# Altium footprint library xialeste-20221209.PcbLib: 113 footprints (part 7 of 8)
Each footprint in its own frame and in the unit in brackets; x right, y up, seen from the top. Pads: shape width x height; smd on the part's side, far side on the other; paste and mask are expansions set on the pad; w line width, h text height; cw(c..) or ccw(c..) is an arc to the next point about the centre after c.
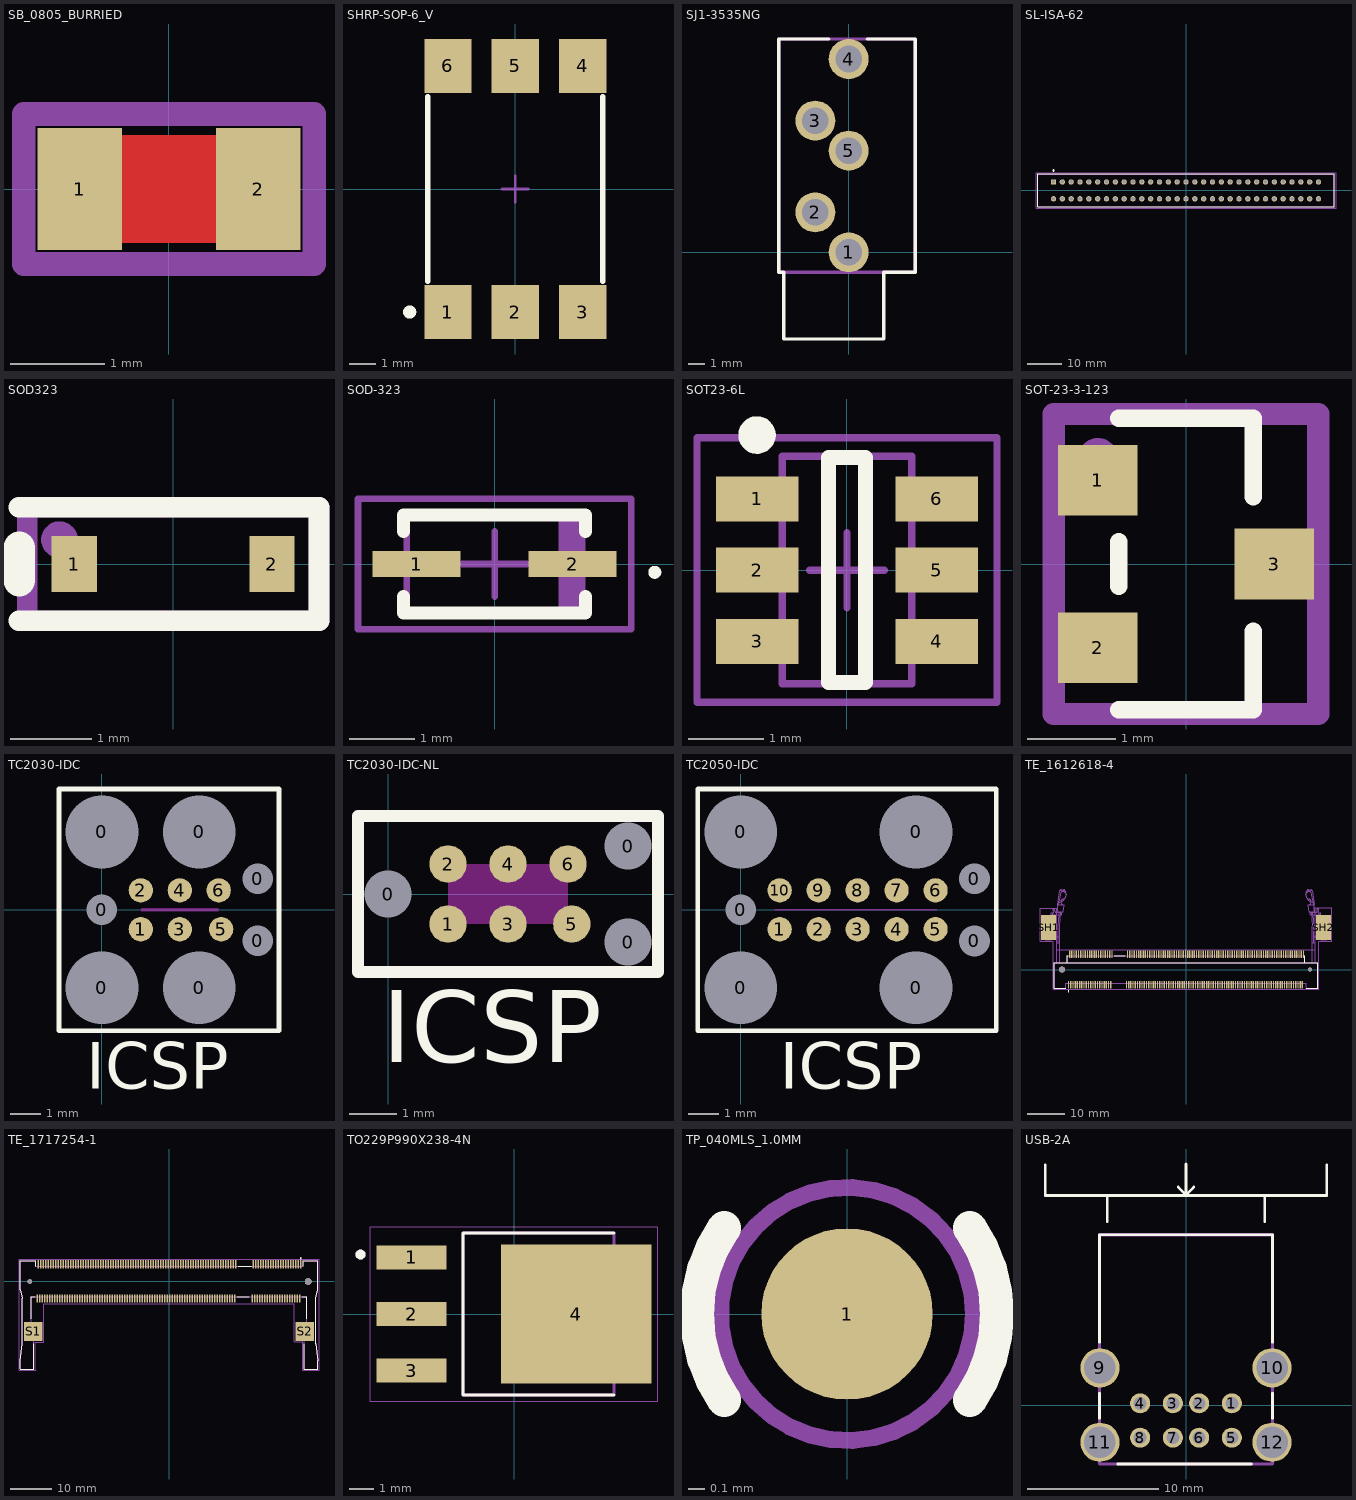
[diagram p6: the footprints below, top view; thin cyan lines are the x and y axes]

## SB_0805_BURRIED [mm]
pads (2):
  rect 0.9x1.3 smd: 1(-0.95,0) 2(0.95,0)
Top Layer:
  region: -0.55,0.575 0.55,0.575 0.55,-0.575 -0.55,-0.575
Mechanical 29:
  lines w0.254: -1.55,-0.8 1.55,-0.8 1.55,0.8 -1.55,0.8 -1.55,-0.8

## SHRP-SOP-6_V [mil] "SOP, 6-Leads, Body 7.12x6.5mm, Pitch 2.54mm"
pads (6):
  rect 70x80 smd: 1(-100,-182.48) 2(0,-182.48) 3(100,-182.48) 4(100,182.48) 5(0,182.48) 6(-100,182.48)
Top Overlay:
  circle w9.84: c-156.69,-182.48 r4.92
  lines w7.87: -129.92,-136.81 -129.92,136.81 ; 129.92,-136.81 129.92,136.81
Mechanical 15:
  lines w3.94: -19.69,0 19.68,0 ; 0,-19.68 0,19.68
3D body "H11L3M.stp": height 156.56, standoff -1.58, extent -173.88,-196 175.88,189.83

## SJ1-3535NG [mm]
pads (5):
  round 2.4 hole 1.6: 1(0,0) 2(-2,2.4) 3(-2,7.9) 4(0,11.6) 5(0,6.1)
Top Overlay:
  lines w0.2: -1.2,12.8 -4.2,12.8 -4.2,-1.2 -3.9,-1.2 -3.9,-5.2 2.1,-5.2 2.1,-1.2 4,-1.2 4,12.8 1.1,12.8
Top Solder:
  region: -1.65,8.65 0.65,6.35 -0.35,5.35 -2.65,7.65
Mechanical 1:
  lines w0.2: -4.2,12.8 -4.2,12.8
Mechanical 29:
  lines w0.2: -4.2,-1.2 4,-1.2 4,12.8 -4.2,12.8 -4.2,-1.2
  text ".Designator" at -2,5.5 h1.2
3D body "ST-215N-01.step": height 12.3, standoff -3.5, extent -4.1,-5.5 4,12.5

## SL-ISA-62 [mil]
pads (62):
  rect 60x60 hole 40: 1(-1500,95.5)
  round 60 hole 40: 2(-1500,-95.5) 3(-1400,95.5) 4(-1400,-95.5) 5(-1300,95.5) 6(-1300,-95.5) 7(-1200,95.5) 8(-1200,-95.5) 9(-1100,95.5) 10(-1100,-95.5) 11(-1000,95.5) 12(-1000,-95.5) 13(-900,95.5) 14(-900,-95.5) 15(-800,95.5) 16(-800,-95.5) 17(-700,95.5) 18(-700,-95.5) 19(-600,95.5) 20(-600,-95.5) 21(-500,95.5) 22(-500,-95.5) 23(-400,95.5) 24(-400,-95.5) 25(-300,95.5) 26(-300,-95.5) 27(-200,95.5) 28(-200,-95.5) 29(-100,95.5) 30(-100,-95.5) 31(0,95.5) 32(0,-95.5) 33(100,95.5) 34(100,-95.5) 35(200,95.5) 36(200,-95.5) 37(300,95.5) 38(300,-95.5) 39(400,95.5) 40(400,-95.5) 41(500,95.5) 42(500,-95.5) 43(600,95.5) 44(600,-95.5) 45(700,95.5) 46(700,-95.5) 47(800,95.5) 48(800,-95.5) 49(900,95.5) 50(900,-95.5) 51(1000,95.5) 52(1000,-95.5) 53(1100,95.5) 54(1100,-95.5) 55(1200,95.5) 56(1200,-95.5) 57(1300,95.5) 58(1300,-95.5) 59(1400,95.5) 60(1400,-95.5) 61(1500,95.5) 62(1500,-95.5)
Top Overlay:
  circle w13.78: c-1500,225 r7.87
  lines w10: -1680,-186.22 -1680,186.22 1680,186.22 1680,-186.22 -1680,-186.22
Mechanical 13:
  lines w10: -1680,-184 -1680,184 1680,184 1680,-184 -1680,-184
Mechanical 15:
  lines w1.97: -1697.83,-201.77 1697.83,-201.77 1697.83,201.77 -1697.83,201.77 -1697.83,-201.77
3D body "c-6-5530843-5-f-3d.stp": height 611.55, standoff -123.45, extent -1680,-184 1680,184

## SOD323 [mil]
pads (2):
  rect 22x27 smd mask+3: 1(-48,0) 2(48,0)
Top Overlay:
  lines w10: -74.8,-27.56 70.87,-27.56 70.87,27.56 -74.8,27.56
  lines w15.75: -74.8,-7.87 -74.8,7.87
Mechanical 29:
  circle w10: c-55.12,11.81 r3.94
  lines w10: -70.87,-27.56 70.87,-27.56 70.87,27.56 -70.87,27.56 -70.87,-27.56
  text ".Designator" at -7.87,-7.87 h15.75
3D body "SOD323.step": height 38.78, standoff -0.2, extent -49.21,-24.6 49.21,24.61

## SOD-323 [mm] "Diode"
height 1
pads (2):
  rect 1.35x0.4 smd: 1(-1.2,0) 2(1.2,0)
Top Overlay:
  circle w0.1: c2.463,-0.127 r0.05
  lines w0.2: -1.4,-0.5 -1.4,-0.75 1.4,-0.75 1.4,-0.5 ; -1.4,0.5 -1.4,0.75 1.4,0.75 1.4,0.5
Mechanical 13:
  region: 1.35,0.724 0.987,0.724 0.987,-0.726 1.35,-0.726
  lines w0.1: -1.35,-0.725 -1.35,0.725 1.35,0.725 1.35,-0.725 -1.35,-0.725
Mechanical 15:
  lines w0.1: -0.5,0 0.5,0 ; 0,-0.5 0,0.5 ; -2.1,-1 -2.1,1 2.1,1 2.1,-1 -2.1,-1
3D body "bat60jfilm.stp": height 1.01, standoff 0, extent -1.243,-0.648 1.243,0.635

## SOT23-6L [mm]
height 1.25
pads (6):
  rect 1.1x0.6 smd: 1(-1.2,0.95) 2(-1.2,0) 3(-1.2,-0.95) 4(1.2,-0.95) 5(1.2,0) 6(1.2,0.95)
Top Overlay:
  circle w0.25: c-1.2,1.8 r0.125
  lines w0.2: -0.25,-1.5 -0.25,1.5 0.25,1.5 0.25,-1.5 -0.25,-1.5
Mechanical 13:
  lines w0.1: -0.865,-1.515 0.865,-1.515 0.865,1.515 -0.865,1.515 -0.865,-1.515
Mechanical 15:
  lines w0.1: -0.5,0 0.5,0 ; 0,-0.5 0,0.5 ; -2,-1.763 2,-1.763 2,1.763 -2,1.763 -2,-1.763
3D body "SOT23-6.step": height 1.1, standoff 0, extent -1.25,-1.5 1.25,1.5

## SOT-23-3-123 [mm]
pads (3):
  rect 0.9x0.8 smd: 1(-1,0.95) 2(-1,-0.95) 3(1,0)
Top Overlay:
  lines w0.2: -0.762,-1.651 0.762,-1.651 0.762,-0.762 ; -0.762,-0.254 -0.762,0.254 ; -0.762,1.651 0.762,1.651 0.762,0.762
Mechanical 29:
  circle w0.254: c-1,1.2 r0.1
  lines w0.254: -1.5,-1.7 -1.5,1.7 1.5,1.7 1.5,-1.7 -1.5,-1.7
  text ".Designator" at 0.3,-0.7 h0.6
3D body: height 0.5, standoff 0, extent -1.27,-1.333 -0.762,-0.572
3D body: height 0.5, standoff 0, extent -1.27,0.572 -0.762,1.333
3D body: height 1.1, standoff 0, extent -0.762,-1.651 0.762,1.651
3D body: height 0.5, standoff 0, extent 0.762,-0.381 1.27,0.381

## TC2030-IDC [mm] "Tag-Connect 6-Pin with Legs (PN# TC2030-IDC-NL)"
pads (13):
  round 2.3 hole 2.375 unplated: 0(0,-2.54) 0(0,2.54) 0(3.175,-2.54) 0(3.175,2.54)
  round 0.9 hole 0.995 unplated: 0(0,0) 0(5.08,-1.016) 0(5.08,1.016)
  round 0.79 smd paste-0.39: 1(1.27,-0.635) 2(1.27,0.635) 3(2.54,-0.635) 4(2.54,0.635) 5(3.89,-0.635) 6(3.81,0.635)
Top Overlay:
  lines w0.15: -1.397,-3.937 5.775,-3.937 5.775,3.937 -1.397,3.937 -1.397,-3.937
  text "ICSP" at -0.508,-5.842 h1.52
Keep-Out Layer:
  rectangle: 1.27,-0.05 3.81,0.05

## TC2030-IDC-NL [mm] "Tag-Connect 6-Pin with No Legs (PN# TC2030-IDC-NL)"
pads (9):
  round 0.9 hole 0.995 unplated: 0(0,0) 0(5.08,-1.016) 0(5.08,1.016)
  round 0.79 smd paste-0.39: 1(1.27,-0.635) 2(1.27,0.635) 3(2.54,-0.635) 4(2.54,0.635) 5(3.89,-0.635) 6(3.81,0.635)
Top Overlay:
  lines w0.254: -0.635,-1.651 5.715,-1.651 5.715,1.651 -0.635,1.651 -0.635,-1.651
  text "ICSP" at -0.127,-3.556 h1.52
Keep-Out Layer:
  rectangle: 1.27,-0.635 3.81,0.635

## TC2050-IDC [mm] "Tag-Connect 6-Pin with Legs (PN# TC2030-IDC-NL)"
pads (17):
  round 2.3 hole 2.375 unplated: 0(0,-2.54) 0(0,2.54) 0(5.715,-2.54) 0(5.715,2.54)
  round 0.9 hole 1 unplated: 0(0,0) 0(7.62,-1.015) 0(7.62,1.015)
  round 0.79 smd paste-0.39: 1(1.27,-0.635) 2(2.54,-0.635) 3(3.81,-0.635) 4(5.08,-0.635) 5(6.35,-0.635) 6(6.35,0.635) 7(5.08,0.635) 8(3.81,0.635) 9(2.54,0.635) 10(1.27,0.635)
Top Overlay:
  lines w0.15: -1.397,-3.937 8.325,-3.937 8.325,3.937 -1.397,3.937 -1.397,-3.937
  text "ICSP" at 1.27,-5.842 h1.52
Keep-Out Layer:
  rectangle: 1.1,-0.025 6.4,0.025

## TE_1612618-4 [mm]
pads (204):
  rect 0.35x2 smd: 1(-31.65,-4.1) 2(-31.35,4.1) 3(-31.05,-4.1) 4(-30.75,4.1) 5(-30.45,-4.1) 6(-30.15,4.1) 7(-29.85,-4.1) 8(-29.55,4.1) 9(-29.25,-4.1) 10(-28.95,4.1) 11(-28.65,-4.1) 12(-28.35,4.1) 13(-28.05,-4.1) 14(-27.75,4.1) 15(-27.45,-4.1) 16(-27.15,4.1) 17(-26.85,-4.1) 18(-26.55,4.1) 19(-26.25,-4.1) 20(-25.95,4.1) 21(-25.65,-4.1) 22(-25.35,4.1) 23(-25.05,-4.1) 24(-24.75,4.1) 25(-24.45,-4.1) 26(-24.15,4.1) 27(-23.85,-4.1) 28(-23.55,4.1) 29(-23.25,-4.1) 30(-22.95,4.1) 31(-22.65,-4.1) 32(-22.35,4.1) 33(-22.05,-4.1) 34(-21.75,4.1) 35(-21.45,-4.1) 36(-21.15,4.1) 37(-20.85,-4.1) 38(-20.55,4.1) 39(-20.25,-4.1) 40(-19.95,4.1) 41(-16.05,-4.1) 42(-15.75,4.1) 43(-15.45,-4.1) 44(-15.15,4.1) 45(-14.85,-4.1) 46(-14.55,4.1) 47(-14.25,-4.1) 48(-13.95,4.1) 49(-13.65,-4.1) 50(-13.35,4.1) 51(-13.05,-4.1) 52(-12.75,4.1) 53(-12.45,-4.1) 54(-12.15,4.1) 55(-11.85,-4.1) 56(-11.55,4.1) 57(-11.25,-4.1) 58(-10.95,4.1) 59(-10.65,-4.1) 60(-10.35,4.1) 61(-10.05,-4.1) 62(-9.75,4.1) 63(-9.45,-4.1) 64(-9.15,4.1) 65(-8.85,-4.1) 66(-8.55,4.1) 67(-8.25,-4.1) 68(-7.95,4.1) 69(-7.65,-4.1) 70(-7.35,4.1) 71(-7.05,-4.1) 72(-6.75,4.1) 73(-6.45,-4.1) 74(-6.15,4.1) 75(-5.85,-4.1) 76(-5.55,4.1) 77(-5.25,-4.1) 78(-4.95,4.1) 79(-4.65,-4.1) 80(-4.35,4.1) 81(-4.05,-4.1) 82(-3.75,4.1) 83(-3.45,-4.1) 84(-3.15,4.1) 85(-2.85,-4.1) 86(-2.55,4.1) 87(-2.25,-4.1) 88(-1.95,4.1) 89(-1.65,-4.1) 90(-1.35,4.1) 91(-1.05,-4.1) 92(-0.75,4.1) 93(-0.45,-4.1) 94(-0.15,4.1) 95(0.15,-4.1) 96(0.45,4.1) 97(0.75,-4.1) 98(1.05,4.1) 99(1.35,-4.1) 100(1.65,4.1) 101(1.95,-4.1) 102(2.25,4.1) 103(2.55,-4.1) 104(2.85,4.1) 105(3.15,-4.1) 106(3.45,4.1) 107(3.75,-4.1) 108(4.05,4.1) 109(4.35,-4.1) 110(4.65,4.1) 111(4.95,-4.1) 112(5.25,4.1) 113(5.55,-4.1) 114(5.85,4.1) 115(6.15,-4.1) 116(6.45,4.1) 117(6.75,-4.1) 118(7.05,4.1) 119(7.35,-4.1) 120(7.65,4.1) 121(7.95,-4.1) 122(8.25,4.1) 123(8.55,-4.1) 124(8.85,4.1) 125(9.15,-4.1) 126(9.45,4.1) 127(9.75,-4.1) 128(10.05,4.1) 129(10.35,-4.1) 130(10.65,4.1) 131(10.95,-4.1) 132(11.25,4.1) 133(11.55,-4.1) 134(11.85,4.1) 135(12.15,-4.1) 136(12.45,4.1) 137(12.75,-4.1) 138(13.05,4.1) 139(13.35,-4.1) 140(13.65,4.1) 141(13.95,-4.1) 142(14.25,4.1) 143(14.55,-4.1) 144(14.85,4.1) 145(15.15,-4.1) 146(15.45,4.1) 147(15.75,-4.1) 148(16.05,4.1) 149(16.35,-4.1) 150(16.65,4.1) 151(16.95,-4.1) 152(17.25,4.1) 153(17.55,-4.1) 154(17.85,4.1) 155(18.15,-4.1) 156(18.45,4.1) 157(18.75,-4.1) 158(19.05,4.1) 159(19.35,-4.1) 160(19.65,4.1) 161(19.95,-4.1) 162(20.25,4.1) 163(20.55,-4.1) 164(20.85,4.1) 165(21.15,-4.1) 166(21.45,4.1) 167(21.75,-4.1) 168(22.05,4.1) 169(22.35,-4.1) 170(22.65,4.1) 171(22.95,-4.1) 172(23.25,4.1) 173(23.55,-4.1) 174(23.85,4.1) 175(24.15,-4.1) 176(24.45,4.1) 177(24.75,-4.1) 178(25.05,4.1) 179(25.35,-4.1) 180(25.65,4.1) 181(25.95,-4.1) 182(26.25,4.1) 183(26.55,-4.1) 184(26.85,4.1) 185(27.15,-4.1) 186(27.45,4.1) 187(27.75,-4.1) 188(28.05,4.1) 189(28.35,-4.1) 190(28.65,4.1) 191(28.95,-4.1) 192(29.25,4.1) 193(29.55,-4.1) 194(29.85,4.1) 195(30.15,-4.1) 196(30.45,4.1) 197(30.75,-4.1) 198(31.05,4.1) 199(31.35,-4.1) 200(31.65,4.1)
  rect 4x6.8 smd: SH1(-37,11.3) SH2(37,11.3)
  round 1.6 hole 1.6 unplated: ""(-33.4,0)
  round 1.1 hole 1.1 unplated: ""(33.4,0)
Top Overlay:
  circle w0.2: c-31.65,-5.85 r0.1
  lines w0.127: -32.35,-5 -35.55,-5 -35.55,1.85 -32,1.85 ; -31.71,3.7 -32,3.7 -32,1.85 ; -19.35,3.7 -16.35,3.7 ; 32,3.7 32,1.85 ; 32.4,-5 35.55,-5 35.55,1.85 32,1.85 ; -32,1.85 32,1.85
Mechanical 13:
  circle w0.2: c-31.646,-3.325 r0.1
  lines w0.127: -36.3,14.7 -34.1,14.7 ; -35.85,9.7 -35.85,15.3 ; -35.846,9.69 -34.418,8.65 ; -34.85,1.842 -34.85,7.25 ; -34.488,18.1 ccw(c-34.45,20.25) -32.3,20.212 ; -34.402,8.64 -34.402,7.25 ; -34.4,7.4 -34.4,11.6 -34.1,14.7 ; -33.957,21.167 -34.6,17.4 ; -33.956,21.169 cw(c-33.562,21.1) -33.562,21.5 -32.947,21.5 cw(c-32.947,21.1) -32.591,21.282 ; -33.95,1.842 -33.95,7.25 -34.402,7.25 ; -33.95,7.3 -33.95,11.7 -33.7,15.4 ; -33.662,20.774 -34.3,17.4 ; -33.661,20.776 cw(c-33.269,20.7) -33.269,21.1 -33.114,21.1 cw(c-33.114,20.7) -32.783,20.924 ; -33.067,15.658 cw(c-33.263,15.7) -33.263,15.5 -34.4,15.5 cw(c-34.4,15.7) -34.6,15.7 -34.6,17.4 ; -33.067,15.66 -32.758,17.16 ccw(c-32.954,17.2) -32.954,17.4 -34.3,17.4 ; -32.781,20.922 -32.7,20.8 ; -32.589,21.279 -32.4,20.9 ; 32.3,20.212 ccw(c34.45,20.25) 34.488,18.1 ; 32.589,21.279 32.4,20.9 ; 32.591,21.282 cw(c32.947,21.1) 32.947,21.5 33.563,21.5 cw(c33.562,21.1) 33.956,21.169 ; 32.781,20.922 32.7,20.8 ; 32.783,20.924 cw(c33.114,20.7) 33.114,21.1 33.269,21.1 cw(c33.269,20.7) 33.661,20.776 ; 33.067,15.658 ccw(c33.263,15.7) 33.263,15.5 34.4,15.5 ccw(c34.4,15.7) 34.6,15.7 34.6,17.4 ; 33.067,15.66 32.758,17.16 cw(c32.954,17.2) 32.954,17.4 34.3,17.4 ; 33.662,20.774 34.3,17.4 ; 33.7,15.4 33.95,11.7 33.95,7.3 ; 33.95,1.842 33.95,7.25 34.402,7.25 ; 33.957,21.167 34.6,17.4 ; 34.4,7.4 34.4,11.6 34.1,14.7 ; 34.402,8.64 34.402,7.25 ; 34.418,8.65 35.846,9.69 ; 34.85,1.842 34.85,7.25 ; 35.85,9.7 35.85,15.3 ; 36.3,14.7 34.1,14.7 ; -36.35,9.692 -34.85,8.65 -34.85,7.25 ; -36.35,9.692 -36.35,8 -37.95,8 -37.95,14.5 -36.35,14.5 ; -36.35,9.692 -36.35,14.5 ; -36.35,14.5 -36.35,15.3 -35.85,15.3 ; -35.85,15.3 -35.6,15.3 -35.6,15.7 -35.8,15.8 -35.8,16.2 ; -35.8,16.2 -35.4,16.2 ; -35.8,16.2 -35.8,16.45 -35.4,16.45 -35.4,16.2 ; -35.4,16.2 -35.4,15.8 -35.2,15.4 -34.1,15.4 ; -34.85,7.25 -34.402,7.25 ; -34.6,17.4 -34.3,17.4 ; -34.1,14.7 -33.5,14.7 -33.5,15.4 -34.1,15.4 ; -34.1,14.7 -34.1,15.4 ; -32.7,20.8 -32.4,20.6 -32.4,20.9 ; -32.7,20.8 -32.4,20.9 ; -32,1.85 -32,3.7 32,3.7 32,1.85 ; -32,1.85 -35.55,1.85 -35.55,-5 -32.35,-5 -32.35,-3.7 32.4,-3.7 32.4,-5 35.55,-5 35.55,1.85 32,1.85 ; -32,1.85 32,1.85 ; 32.4,20.9 32.4,20.6 32.7,20.8 ; 32.4,20.9 32.7,20.8 ; 34.1,14.7 33.5,14.7 33.5,15.4 34.1,15.4 ; 34.1,14.7 34.1,15.4 ; 34.1,15.4 35.2,15.4 35.4,15.8 35.4,16.2 ; 34.3,17.4 34.6,17.4 ; 34.402,7.25 34.85,7.25 ; 34.85,7.25 34.85,8.65 36.35,9.692 ; 35.4,16.2 35.8,16.2 ; 35.4,16.2 35.4,16.45 35.8,16.45 35.8,16.2 ; 35.8,16.2 35.8,15.8 35.6,15.7 35.6,15.3 35.85,15.3 ; 35.85,15.3 36.35,15.3 36.35,14.5 ; 36.35,9.692 36.35,8 37.95,8 37.95,14.5 36.35,14.5 ; 36.35,9.692 36.35,14.5
  lines w0.254: -33.701,18.205 cw(c-33.1,18.3) -33.195,18.901 ; -33.7,18.2 ccw(c-32.9,18.2) -32.9,17.4 ; -33.206,18.899 ccw(c-33.4,20) -32.299,20.194 ; -32.4,20.6 -32.3,20.2 ; 32.299,20.194 ccw(c33.4,20) 33.206,18.899 ; 32.3,20.2 32.4,20.6 ; 32.9,17.4 ccw(c32.9,18.2) 33.7,18.2 ; 33.195,18.901 cw(c33.1,18.3) 33.701,18.205
Mechanical 15:
  lines w0.05: -39.25,7.65 -39.25,16.5 -34.8,16.5 -34.8,5.35 34.8,5.35 34.8,16.6 39.25,16.6 39.25,7.65 35.8,7.65 35.8,-5.35 -35.8,-5.35 -35.8,7.65 -39.25,7.65
3D body "1612618-4.stp": height 9.47, standoff -0.66, extent -37.9,-5 38,21.556

## TE_1717254-1 [mm]
height 0.254
pads (204):
  rect 0.35x2 smd: 1(31.65,4.1) 2(31.35,-4.1) 3(31.05,4.1) 4(30.75,-4.1) 5(30.45,4.1) 6(30.15,-4.1) 7(29.85,4.1) 8(29.55,-4.1) 9(29.25,4.1) 10(28.95,-4.1) 11(28.65,4.1) 12(28.35,-4.1) 13(28.05,4.1) 14(27.75,-4.1) 15(27.45,4.1) 16(27.15,-4.1) 17(26.85,4.1) 18(26.55,-4.1) 19(26.25,4.1) 20(25.95,-4.1) 21(25.65,4.1) 22(25.35,-4.1) 23(25.05,4.1) 24(24.75,-4.1) 25(24.45,4.1) 26(24.15,-4.1) 27(23.85,4.1) 28(23.55,-4.1) 29(23.25,4.1) 30(22.95,-4.1) 31(22.65,4.1) 32(22.35,-4.1) 33(22.05,4.1) 34(21.75,-4.1) 35(21.45,4.1) 36(21.15,-4.1) 37(20.85,4.1) 38(20.55,-4.1) 39(20.25,4.1) 40(19.95,-4.1) 41(16.05,4.1) 42(15.75,-4.1) 43(15.45,4.1) 44(15.15,-4.1) 45(14.85,4.1) 46(14.55,-4.1) 47(14.25,4.1) 48(13.95,-4.1) 49(13.65,4.1) 50(13.35,-4.1) 51(13.05,4.1) 52(12.75,-4.1) 53(12.45,4.1) 54(12.15,-4.1) 55(11.85,4.1) 56(11.55,-4.1) 57(11.25,4.1) 58(10.95,-4.1) 59(10.65,4.1) 60(10.35,-4.1) 61(10.05,4.1) 62(9.75,-4.1) 63(9.45,4.1) 64(9.15,-4.1) 65(8.85,4.1) 66(8.55,-4.1) 67(8.25,4.1) 68(7.95,-4.1) 69(7.65,4.1) 70(7.35,-4.1) 71(7.05,4.1) 72(6.75,-4.1) 73(6.45,4.1) 74(6.15,-4.1) 75(5.85,4.1) 76(5.55,-4.1) 77(5.25,4.1) 78(4.95,-4.1) 79(4.65,4.1) 80(4.35,-4.1) 81(4.05,4.1) 82(3.75,-4.1) 83(3.45,4.1) 84(3.15,-4.1) 85(2.85,4.1) 86(2.55,-4.1) 87(2.25,4.1) 88(1.95,-4.1) 89(1.65,4.1) 90(1.35,-4.1) 91(1.05,4.1) 92(0.75,-4.1) 93(0.45,4.1) 94(0.15,-4.1) 95(-0.15,4.1) 96(-0.45,-4.1) 97(-0.75,4.1) 98(-1.05,-4.1) 99(-1.35,4.1) 100(-1.65,-4.1) 101(-1.95,4.1) 102(-2.25,-4.1) 103(-2.55,4.1) 104(-2.85,-4.1) 105(-3.15,4.1) 106(-3.45,-4.1) 107(-3.75,4.1) 108(-4.05,-4.1) 109(-4.35,4.1) 110(-4.65,-4.1) 111(-4.95,4.1) 112(-5.25,-4.1) 113(-5.55,4.1) 114(-5.85,-4.1) 115(-6.15,4.1) 116(-6.45,-4.1) 117(-6.75,4.1) 118(-7.05,-4.1) 119(-7.35,4.1) 120(-7.65,-4.1) 121(-7.95,4.1) 122(-8.25,-4.1) 123(-8.55,4.1) 124(-8.85,-4.1) 125(-9.15,4.1) 126(-9.45,-4.1) 127(-9.75,4.1) 128(-10.05,-4.1) 129(-10.35,4.1) 130(-10.65,-4.1) 131(-10.95,4.1) 132(-11.25,-4.1) 133(-11.55,4.1) 134(-11.85,-4.1) 135(-12.15,4.1) 136(-12.45,-4.1) 137(-12.75,4.1) 138(-13.05,-4.1) 139(-13.35,4.1) 140(-13.65,-4.1) 141(-13.95,4.1) 142(-14.25,-4.1) 143(-14.55,4.1) 144(-14.85,-4.1) 145(-15.15,4.1) 146(-15.45,-4.1) 147(-15.75,4.1) 148(-16.05,-4.1) 149(-16.35,4.1) 150(-16.65,-4.1) 151(-16.95,4.1) 152(-17.25,-4.1) 153(-17.55,4.1) 154(-17.85,-4.1) 155(-18.15,4.1) 156(-18.45,-4.1) 157(-18.75,4.1) 158(-19.05,-4.1) 159(-19.35,4.1) 160(-19.65,-4.1) 161(-19.95,4.1) 162(-20.25,-4.1) 163(-20.55,4.1) 164(-20.85,-4.1) 165(-21.15,4.1) 166(-21.45,-4.1) 167(-21.75,4.1) 168(-22.05,-4.1) 169(-22.35,4.1) 170(-22.65,-4.1) 171(-22.95,4.1) 172(-23.25,-4.1) 173(-23.55,4.1) 174(-23.85,-4.1) 175(-24.15,4.1) 176(-24.45,-4.1) 177(-24.75,4.1) 178(-25.05,-4.1) 179(-25.35,4.1) 180(-25.65,-4.1) 181(-25.95,4.1) 182(-26.25,-4.1) 183(-26.55,4.1) 184(-26.85,-4.1) 185(-27.15,4.1) 186(-27.45,-4.1) 187(-27.75,4.1) 188(-28.05,-4.1) 189(-28.35,4.1) 190(-28.65,-4.1) 191(-28.95,4.1) 192(-29.25,-4.1) 193(-29.55,4.1) 194(-29.85,-4.1) 195(-30.15,4.1) 196(-30.45,-4.1) 197(-30.75,4.1) 198(-31.05,-4.1) 199(-31.35,4.1) 200(-31.65,-4.1)
  rect 4.5x4.6 smd: S1(-32.55,-12) S2(32.55,-12)
  round 1.1 hole 1.1 unplated: ""(-33.4,0)
  round 1.6 hole 1.6 unplated: ""(33.4,0)
Top Overlay:
  circle w0.2: c31.65,5.55 r0.1
  lines w0.127: -35.75,-21 -32.4,-21 -32.4,-15 ; -35.75,-20.95 -35.7,-19 -35.2,-15 -35.2,-4.05 -35.75,-2 -35.75,5 -32,5 -32,3.7 ; -33,-9 -33,-3.7 -32.1,-3.7 ; 16.3,-3.7 19.3,-3.7 ; 16.6,3.7 19.7,3.7 ; 31.9,-3.7 33,-3.7 33,-9 ; 32.2,3.7 32.2,5 35.75,5 35.75,-2 35.2,-4.05 35.2,-15 35.7,-19 35.7,-20.99 ; 32.4,-15 32.4,-21 35.69,-21
Mechanical 13:
  lines w0.127: -35.75,-21 -32.4,-21 -32.4,-13.7 -31.65,-13.7 -31.65,-10.1 -33,-10.1 -33,-3.7 33,-3.7 33,-10.1 31.65,-10.1 31.65,-13.7 32.4,-13.7 32.4,-21 35.69,-21 ; -35.75,-20.95 -35.7,-19 -35.2,-15 -35.2,-4.05 -35.75,-2 -35.75,5 -32,5 -32,3.7 32.2,3.7 32.2,5 35.75,5 35.75,-2 35.2,-4.05 35.2,-15 35.7,-19 35.7,-20.99
Mechanical 15:
  lines w0.05: -36,-21.25 -36,5.35 36,5.35 36,-21.25 32.05,-21.25 32.05,-14.5 30.05,-14.5 30.05,-5.35 -30.05,-5.35 -30.05,-14.6 -32.1,-14.6 -32.1,-21.1 -31.95,-21.25 -36,-21.25
3D body "1717254-1.stp": height 5.23, standoff -0.67, extent -35.75,-21.09 35.75,4.95

## TO229P990X238-4N [mm]
pads (4):
  rect 2.83x0.97 smd: 1(-4.14,2.29) 2(-4.14,0) 3(-4.14,-2.29)
  rect 6.09x5.63 smd paste-4: 4(2.51,0)
Top Overlay:
  circle w0.2: c-6.2,2.4 r0.1
  lines w0.127: 4.03,-3.27 -2.065,-3.27 -2.065,3.27 4.03,3.27
Mechanical 13:
  circle w0.2: c-6.2,2.4 r0.1
  lines w0.127: -2.065,-3.27 4.03,-3.27 4.03,3.27 -2.065,3.27 -2.065,-3.27
Mechanical 15:
  lines w0.05: -5.81,-3.52 5.81,-3.52 5.81,3.52 -5.81,3.52 -5.81,-3.52
3D body "step_temp.STEP": height 2.39, standoff -0.13, extent -4.953,-3.25 4.953,3.25

## TP_040MLS_1.0MM [mil] "Testpoint, Surface Mounting, Circular, Pad Diameter 1mm"
pads (1):
  round 40 smd: 1(0,0)
Top Overlay:
  lines w7.87: -28.67,-20.08 cw(c0,0) -28.67,20.08 ; 28.67,-20.08 ccw(c0,0) 28.67,20.08
Mechanical 15:
  circle w3.94: c0,0 r29.53

## USB-2A [mm]
pads (12):
  round 1.524 hole 1: 1(3.5,0.13) 2(1,0.13) 3(-1,0.13) 4(-3.5,0.13) 5(3.5,-2.49) 6(1,-2.49) 7(-1,-2.49) 8(-3.5,-2.49)
  round 3 hole 2.4: 9(-6.57,2.84) 10(6.57,2.84) 11(-6.57,-2.84) 12(6.57,-2.84)
Top Overlay:
  lines w0.2: -10.75,18.35 -10.75,16 10.75,16 10.75,18.35 ; -6.6,-1 -6.6,0.9 ; -6.6,4.8 -6.6,13 6.6,13 6.6,4.8 ; -6,14 -6,16 ; -5.2,-4.5 5,-4.5 ; -0.6,16.65 0,16.05 ; 0,18.4 0,16.05 ; 0.6,16.65 0,16.05 ; 6,14 6,16 ; 6.6,-1 6.6,0.9
Mechanical 29:
  lines w0.254: -6.6,-4.5 6.6,-4.5 6.6,13 -6.6,13 -6.6,-4.5
  text ".Designator" at -2,5.8 h1
3D body "usb double.STEP": height 15.69, standoff -3.06, extent -7.798,-4.458 7.798,13.462